# Altium footprint library Project_Vega.PcbLib: 50 footprints (part 2 of 4)
Each footprint in its own frame and in the unit in brackets; x right, y up, seen from the top. Pads: shape width x height; smd on the part's side, far side on the other; paste and mask are expansions set on the pad; w line width, h text height; cw(c..) or ccw(c..) is an arc to the next point about the centre after c.
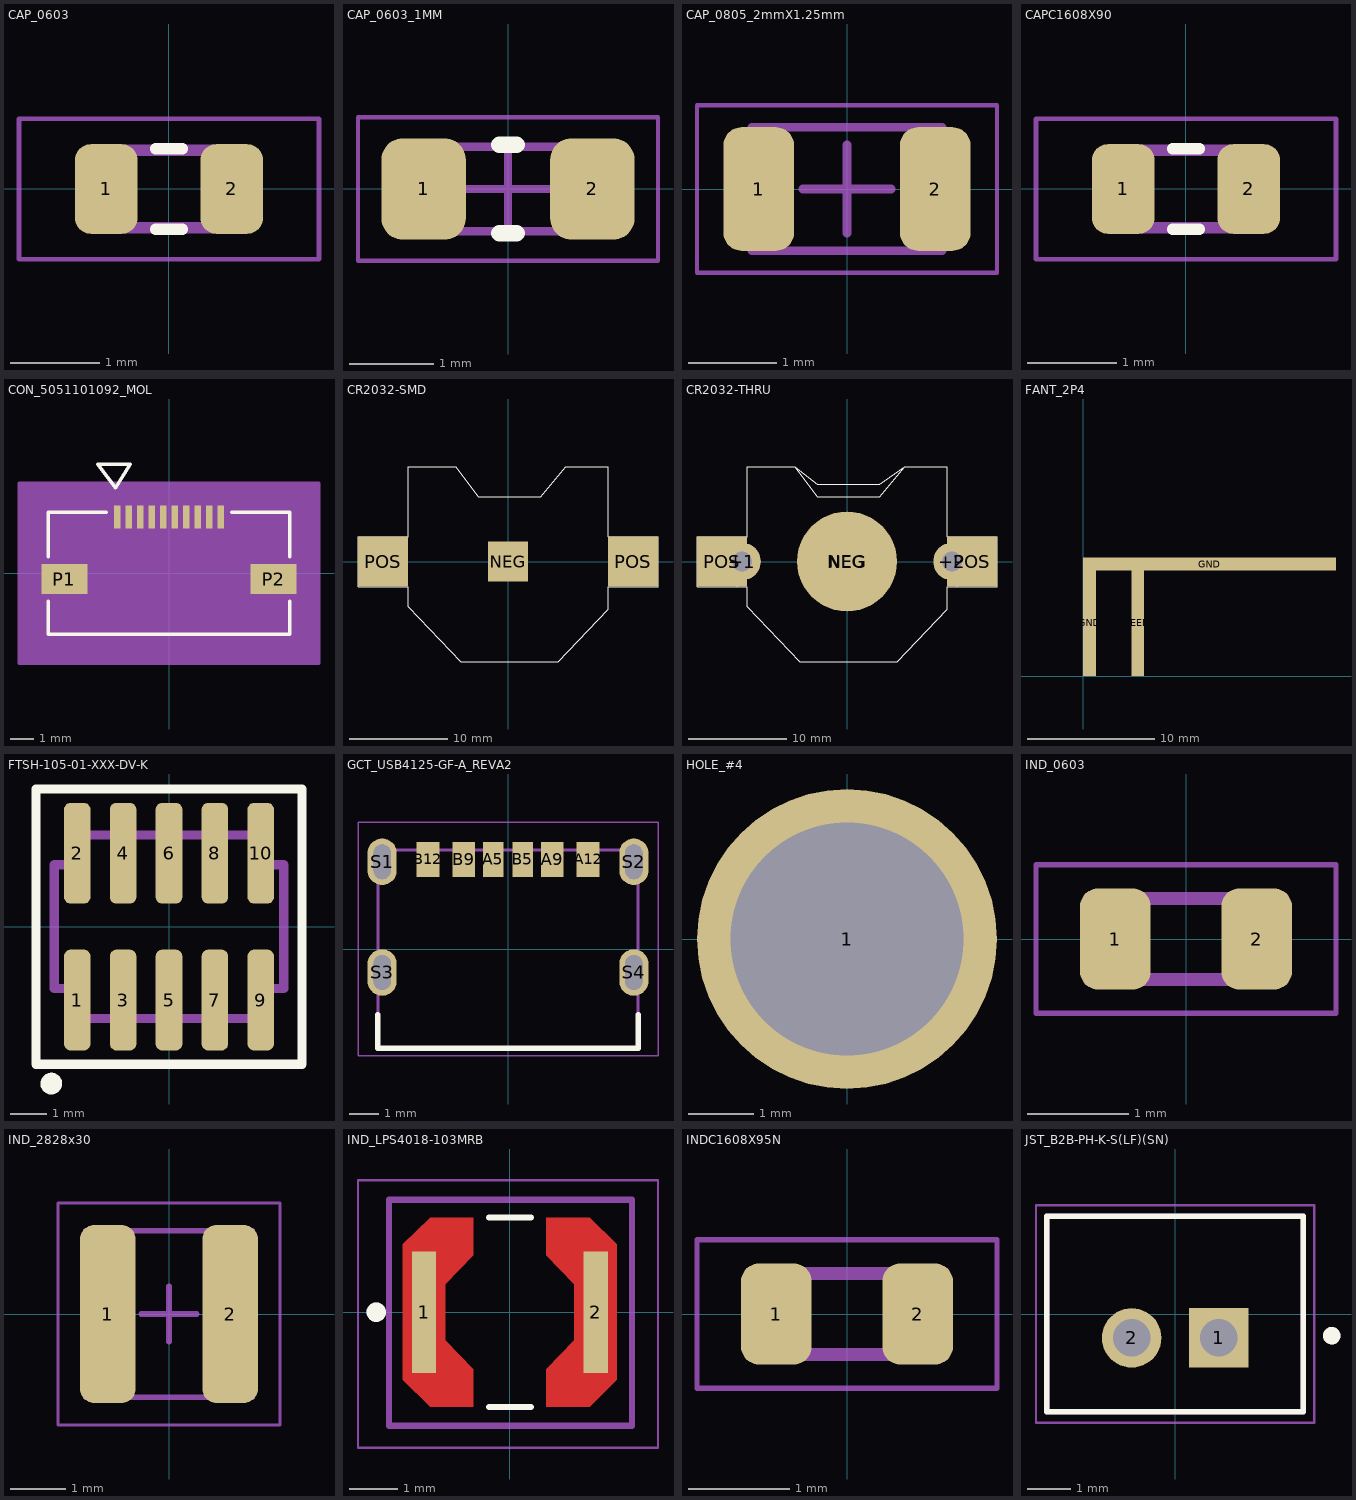
[diagram p1: the footprints below, top view; thin cyan lines are the x and y axes]

## CAP_0603 [mm] "Ceramic Capacitor 0603"
pads (2):
  rrect50% 0.7x1 smd: 1(-0.7,0) 2(0.7,0)
Top Overlay:
  lines w0.127: -0.15,-0.45 0.15,-0.45 ; -0.15,0.45 0.15,0.45
Mechanical 13:
  lines w0.127: -0.838,-0.432 0.838,-0.432 0.838,0.432 -0.838,0.432 -0.838,-0.419
  text ".Designator" at -0.048,-0.179 h0.51
Mechanical 15:
  lines w0.051: -1.673,-0.783 1.673,-0.783 1.673,0.783 -1.673,0.783 -1.673,-0.783
3D body "step_temp.STEP": height 0.9, standoff 0, extent -0.8,-0.4 0.8,0.4

## CAP_0603_1MM [mm] "Chip Capacitor, 2-Leads, Body 1.60x0.80mm, IPC Medium Density"
height 1
pads (2):
  rrect50% 1x1.2 smd: 1(-1,0) 2(1,0)
Top Overlay:
  lines w0.2: -0.1,-0.525 0.1,-0.525 ; -0.1,0.525 0.1,0.525
Mechanical 13:
  lines w0.1: -0.9,-0.5 -0.9,0.5 0.9,0.5 0.9,-0.5 -0.9,-0.5
  text ".Designator" at -0.723,-0.254 h0.5
Mechanical 15:
  lines w0.05: -1.778,-0.85 -1.778,0.85 1.778,0.85 1.778,-0.85 -1.778,-0.85
  lines w0.1: -0.5,0 0.5,0 ; 0,-0.5 0,0.5
3D body "CAP_0603_1608X10.step": height 1, standoff 0, extent -0.9,-0.5 0.9,0.5

## CAP_0805_2mmX1.25mm [mm]
height 1.4
pads (2):
  rrect50% 0.8x1.4 smd: 1(-1,0) 2(1,0)
Mechanical 13:
  lines w0.1: -1.075,-0.7 -1.075,0.7 1.075,0.7 1.075,-0.7 -1.075,-0.7
  text ".Designator" at -0.82,-0.42 h0.9
Mechanical 15:
  lines w0.05: -1.7,-0.95 -1.7,0.95 1.7,0.95 1.7,-0.95 -1.7,-0.95
  lines w0.1: -0.5,0 0.5,0 ; 0,-0.5 0,0.5
3D body "GRM21BR61E106KA73K.step": height 1.23, standoff -0.02, extent -1,-0.7 1,0.7

## CAPC1608X90 [mm]
pads (2):
  rrect50% 0.7x1 smd: 1(-0.7,0) 2(0.7,0)
Top Overlay:
  lines w0.127: -0.15,-0.45 0.15,-0.45 ; -0.15,0.45 0.15,0.45
Mechanical 13:
  lines w0.127: -0.838,-0.432 0.838,-0.432 0.838,0.432 -0.838,0.432 -0.838,-0.419
  text ".Designator" at -0.61,-0.178 h0.15
Mechanical 15:
  lines w0.051: -1.673,-0.783 -1.673,0.783 1.673,0.783 1.673,-0.783 -1.673,-0.783
3D body "step_temp.STEP": height 0.9, standoff 0, extent -0.8,-0.4 0.8,0.4

## CON_5051101092_MOL [mm] "10 Position FFC, FPC Connector Contacts, Bottom 0.020\" (0.50mm) Surface Mount, Right Angle"
pads (12):
  rect 0.3x1 smd paste+0 mask+0.025: 1(-2.25,2.45) 2(-1.75,2.45) 3(-1.25,2.45) 4(-0.75,2.45) 5(-0.25,2.45) 6(0.25,2.45) 7(0.75,2.45) 8(1.25,2.45) 9(1.75,2.45) 10(2.25,2.45)
  rect 2x1.3 smd paste+0 mask+0.025: P1(-4.55,-0.25) P2(4.55,-0.25)
Top Overlay:
  lines w0.152: -5.25,-1.22 -5.25,-2.65 5.25,-2.65 5.25,-1.22 ; -5.25,0.72 -5.25,2.65 -2.72,2.65 ; 2.72,2.65 5.25,2.65 5.25,0.72 ; -3.091,4.736 -2.329,3.72 -1.694,4.736 -3.091,4.736
Mechanical 13:
  lines w0.127: -5.25,-2.65 -5.25,2.65 5.25,2.65 5.25,-2.65 -5.25,-2.65 ; -3.091,4.736 -2.329,3.72 -1.694,4.736 -3.091,4.736
  text ".Designator" at -4.572,-2.159 h1.27
Mechanical 15:
  pour cut-out: 6.52,3.92 -6.52,3.92 -6.52,-3.92 6.52,-3.92
  region: 6.52,3.92 -6.52,3.92 -6.52,-3.92 6.52,-3.92
  lines w0.127: -6.52,-3.92 6.52,-3.92 ; -6.52,-3.92 -6.52,3.92 ; -6.52,-3.92 6.52,-3.92 ; -6.52,-3.92 -6.52,3.92 ; -6.52,3.92 6.52,3.92 ; -6.52,3.92 6.52,3.92 ; 6.52,-3.92 6.52,3.92 ; 6.52,-3.92 6.52,3.92
3D body "5051101092.stp": height 1.88, standoff -0.02, extent -5.25,-2.724 5.25,2.576

## CR2032-SMD [mil]
pads (3):
  rect 160x160 smd: NEG(0,0)
  rect 200x200 smd: POS(-500,0) POS(500,0)
Top Overlay:
  circle w5: c-510,0 r36.06
  circle w5: c500,10 r36.06
  lines w5: -600,-100 -400,-100 -400,-180 -190,-400 200,-400 400,-190 400,-100 600,-100 600,100 400,100 400,380 230,380 130,260 -120,260 -210,380 -400,380 -400,100 -600,100 -600,-100
Top Solder:
  region: 18.54,353.85 37.04,352.39 55.43,349.97 73.67,346.59 91.71,342.26 109.49,336.99 126.98,330.8 144.12,323.7 160.86,315.71 177.17,306.86 192.98,297.17 208.27,286.66 222.99,275.37 237.09,263.32 250.55,250.55 263.32,237.09 275.37,222.99 286.66,208.27 297.17,192.98 306.86,177.17 315.71,160.86 323.7,144.12 330.8,126.98 336.99,109.49 342.26,91.71 346.59,73.67 349.97,55.43 352.39,37.04 353.85,18.54 354.33,0 353.85,-18.54 352.39,-37.04 349.97,-55.43 346.59,-73.67 342.26,-91.71 336.99,-109.49 330.8,-126.98 323.7,-144.12 315.71,-160.86 306.86,-177.17 297.17,-192.98 286.66,-208.27 275.37,-222.99 263.32,-237.09 250.55,-250.55 237.09,-263.32 222.99,-275.37 208.27,-286.66 192.98,-297.17 177.17,-306.86 160.86,-315.71 144.12,-323.7 126.98,-330.8 109.49,-336.99 91.71,-342.26 73.67,-346.59 55.43,-349.97 37.04,-352.39 18.54,-353.85 0,-354.33 -18.54,-353.85 -37.04,-352.39 -55.43,-349.97 -73.67,-346.59 -91.71,-342.26 -109.49,-336.99 -126.98,-330.8 -144.12,-323.7 -160.86,-315.71 -177.17,-306.86 -192.98,-297.17 -208.27,-286.66 -222.99,-275.37 -237.09,-263.32 -250.55,-250.55 -263.32,-237.09 -275.37,-222.99 -286.66,-208.27 -297.17,-192.98 -306.86,-177.17 -315.71,-160.86 -323.7,-144.12 -330.8,-126.98 -336.99,-109.49 -342.26,-91.71 -346.59,-73.67 -349.97,-55.43 -352.39,-37.04 -353.85,-18.54 -354.33,0 -353.85,18.54 -352.39,37.04 -349.97,55.43 -346.59,73.67 -342.26,91.71 -336.99,109.49 -330.8,126.98 -323.7,144.12 -315.71,160.86 -306.86,177.17 -297.17,192.98 -286.66,208.27 -275.37,222.99 -263.32,237.09 -250.55,250.55 -237.09,263.32 -222.99,275.37 -208.27,286.66 -192.98,297.17 -177.17,306.86 -160.86,315.71 -144.12,323.7 -126.98,330.8 -109.49,336.99 -91.71,342.26 -73.67,346.59 -55.43,349.97 -37.04,352.39 -18.54,353.85 0,354.33
Mechanical 1:
  text ".Designator" at -139,-379 h30
3D body "CR2032--3DModel-STEP-56544.STEP": height 125.98, standoff 0, extent -393.7,-393.7 393.7,393.7

## CR2032-THRU [mil]
pads (6):
  round 150 hole 78.74: +1(-420,0) +2(420,0)
  round 400 smd: NEG(0,0)
  rect 160x160 smd: NEG(0,0)
  rect 200x200 smd: POS(-500,0) POS(500,0)
Top Overlay:
  circle w5: c500,10 r36.06
  circle w5: c-510,0 r36.06
  lines w5: -400,-180 -190,-400 ; -400,-180 -400,-100 ; -400,-180 -190,-400 ; -400,-180 -400,-100 ; -400,-100 -440,-100 -440,100 -400,100 ; -400,-100 -600,-100 -600,100 -400,100 ; -400,100 -400,380 ; -400,100 -400,380 ; -400,380 -210,380 ; -400,380 -210,380 ; -210,380 -120,310 130,310 230,380 ; -210,380 -120,260 130,260 230,380 ; -190,-400 200,-400 ; -190,-400 200,-400 ; 200,-400 400,-190 ; 200,-400 400,-190 ; 230,380 400,380 ; 230,380 400,380 ; 400,-190 400,-100 ; 400,-190 400,-100 ; 400,-100 440,-100 440,100 400,100 ; 400,-100 600,-100 600,100 400,100 ; 400,100 400,380 ; 400,100 400,380
Top Solder:
  drawing of 2 lines, arcs and shapes, not listed
Mechanical 1:
  text ".Designator" at -130,-375.01 h60
3D body "CR2032--3DModel-STEP-56544.STEP": height 125.98, standoff 0, extent -393.7,-393.7 393.7,393.7

## FANT_2P4 [mil]
pads (3):
  rect 40x331 smd paste-1000 mask+4: FEED(169,165.5) GND(20,165.5)
  rect 782x39 smd paste-1000 mask+4: GND(391,346.5)

## FTSH-105-01-XXX-DV-K [mil]
pads (10):
  rrect50% 29x110 smd mask+2: 1(-100,-80) 2(-100,80) 3(-50,-80) 4(-50,80) 5(0,-80) 6(0,80) 7(50,-80) 8(50,80) 9(100,-80) 10(100,80)
Top Overlay:
  lines w10: -145,-150 145,-150 145,150 -145,150 -145,-150
  lines w11.81: -122.39,-171.52 cw(c-128.27,-171.01) -122.37,-171.01
Mechanical 1:
  lines w10: -125,-67.5 -100,-67.5 -100,-100 100,-100 100,-67.5 125,-67.5 125,67.5 100,67.5 100,100 -100,100 -100,67.5 -125,67.5 -125,-67.5
  text ".Designator" at -97.68,-8.48 h19.68
3D body "FTSH-105-01-LM-DV-K.stp": height 240.75, standoff -0.25, extent -124.99,-114.99 125,115

## GCT_USB4125-GF-A_REVA2 [mm]
pads (10):
  rect 0.7x1.2 smd mask+0.051: A5(-0.5,3.08) B5(0.5,3.08)
  rect 0.76x1.2 smd mask+0.051: A9(1.52,3.08) B9(-1.52,3.08)
  rect 0.8x1.2 smd mask+0.051: A12(2.75,3.08) B12(-2.75,3.08)
  oval 1x1.6 hole 0.6 slot 1.2 at 90 deg mask+0: S1(-4.32,3) S2(4.32,3) S3(-4.32,-0.8) S4(4.32,-0.8)
Top Overlay:
  lines w0.2: -4.47,-2.25 -4.47,-3.4 4.47,-3.4 4.47,-2.25
Top Solder:
  drawing of 4 lines, arcs and shapes, not listed
Bottom Solder:
  drawing of 4 lines, arcs and shapes, not listed
Mechanical 1:
  text ".Designator" at -3.322,-2.363 h0.5
Mechanical 13:
  lines w0.1: -4.47,-3.4 -4.47,3.4 4.47,3.4 4.47,-3.4 -4.47,-3.4
Mechanical 15:
  lines w0.05: -5.15,-3.65 -5.15,4.35 5.15,4.35 5.15,-3.65 -5.15,-3.65
3D body "USB4125-GF-A--3DModel-STEP-56544.STEP": height 3.26, standoff -1.25, extent -4.47,-3.45 4.47,3.45

## HOLE_#4 [mil]
pads (1):
  round 180 hole 140: 1(0,0)

## IND_0603 [mm] "Inductor Package 0603"
pads (2):
  rrect50% 0.7x1 smd: 1(-0.7,0) 2(0.7,0)
Mechanical 13:
  lines w0.127: -0.8,-0.4 -0.8,0.4 0.8,0.4 0.8,-0.4 -0.8,-0.4
  text ".Designator" at -0.152,-0.339 h0.51
Mechanical 15:
  lines w0.05: -1.485,-0.735 1.485,-0.735 1.485,0.735 -1.485,0.735 -1.485,-0.735
3D body "step_temp.STEP": height 0.95, standoff 0, extent -0.8,-0.4 0.8,0.4

## IND_2828x30 [mm] "Precision Wire Wound Inductor, 2-Leads, Body 2.80x2.80mm, IPC Medium Density"
height 3
pads (2):
  rrect50% 1x3.2 smd: 1(-1.1,0) 2(1.1,0)
Mechanical 13:
  lines w0.1: -1.5,-1.5 1.5,-1.5 1.5,1.5 -1.5,1.5 -1.5,-1.5
  text ".Designator" at -1.12,-1.02 h0.9
Mechanical 15:
  lines w0.05: -2,-2 -2,2 2,2 2,-2 -2,-2
  lines w0.1: -0.5,0 0.5,0 ; 0,-0.5 0,0.5
3D body "744025001_Download_STP_WE-TPC-2828_rev1.stp": height 2.8, standoff 0, extent -1.4,-1.4 1.4,1.4

## IND_LPS4018-103MRB [mm]
height 1.8
pads (2):
  rect 0.5x2.5 smd paste-2 mask+0: 1(-1.765,0) 2(1.765,0)
Top Layer:
  region: 2.2,1.395 2.2,-1.395 1.64,-1.945 0.75,-1.945 0.75,-1.17 1.33,-0.575 1.33,0.575 0.75,1.17 0.75,1.945 1.64,1.945
  region: -0.75,1.17 -1.33,0.575 -1.33,-0.575 -0.75,-1.17 -0.75,-1.945 -1.64,-1.945 -2.2,-1.395 -2.2,1.395 -1.64,1.945 -0.75,1.945
Top Overlay:
  circle w0.2: c-2.75,0 r0.1
  lines w0.127: -0.43,-1.95 0.43,-1.95 ; -0.43,1.95 0.43,1.95
Top Paste:
  region: 2.2,1.395 2.2,-1.395 1.64,-1.945 0.75,-1.945 0.75,-1.17 1.33,-0.575 1.33,0.575 0.75,1.17 0.75,1.945 1.64,1.945
  region: -0.75,1.17 -1.33,0.575 -1.33,-0.575 -0.75,-1.17 -0.75,-1.945 -1.64,-1.945 -2.2,-1.395 -2.2,1.395 -1.64,1.945 -0.75,1.945
Top Solder:
  region: 2.3,1.437 2.3,-1.437 1.681,-2.045 0.65,-2.045 0.65,-1.129 1.23,-0.534 1.23,0.534 0.65,1.129 0.65,2.045 1.681,2.045
  region: -0.65,1.129 -1.23,0.534 -1.23,-0.534 -0.65,-1.129 -0.65,-2.045 -1.681,-2.045 -2.3,-1.437 -2.3,1.437 -1.681,2.045 -0.65,2.045
Mechanical 13:
  circle w0.2: c-2.75,0 r0.1
  lines w0.127: -2.489,-2.337 -2.489,2.311 2.515,2.311 2.515,-2.337 -2.489,-2.337
  text ".Designator" at -0.279,-0.347 h1.02
Mechanical 15:
  lines w0.05: -3.124,-2.794 -3.124,2.718 3.048,2.718 3.048,-2.794 -3.124,-2.794

## INDC1608X95N [mm]
pads (2):
  rrect50% 0.7x1 smd: 1(-0.7,0) 2(0.7,0)
Mechanical 13:
  lines w0.127: -0.8,-0.4 0.8,-0.4 0.8,0.4 -0.8,0.4 -0.8,-0.4
  text ".Designator" at -0.584,-0.119 h0.25
Mechanical 15:
  lines w0.05: -1.485,-0.735 -1.485,0.735 1.485,0.735 1.485,-0.735 -1.485,-0.735
3D body "step_temp.STEP": height 0.95, standoff 0, extent -0.8,-0.4 0.8,0.4

## JST_B2B-PH-K-S(LF)(SN) [mm]
pads (2):
  rect 1.368x1.368 / inner round 1.368 / far side rect 1.368x1.368 hole 0.86: 1(1,-0.55)
  round 1.368 hole 0.86: 2(-1,-0.55)
Top Overlay:
  circle w0.2: c3.6,-0.5 r0.1
  lines w0.127: -2.95,-2.25 2.95,-2.25 2.95,2.25 -2.95,2.25 -2.95,-2.25
Mechanical 1:
  text ".Designator" at -2.433,1.066 h0.5
Mechanical 13:
  circle w0.2: c3.6,-0.5 r0.1
  lines w0.127: -2.95,-2.25 -2.95,2.25 2.95,2.25 2.95,-2.25 -2.95,-2.25
Mechanical 15:
  lines w0.05: -3.2,-2.5 -3.2,2.5 3.2,2.5 3.2,-2.5 -3.2,-2.5
3D body "B2B-PH-K-S(LF)(SN)--3DModel-STEP-56544.STEP": height 6.05, standoff -3.35, extent -2.95,-2.25 2.95,2.25